# Altium footprint library 总库.PcbLib: 264 footprints (part 2 of 17)
Each footprint in its own frame and in the unit in brackets; x right, y up, seen from the top. Pads: shape width x height; smd on the part's side, far side on the other; paste and mask are expansions set on the pad; w line width, h text height; cw(c..) or ccw(c..) is an arc to the next point about the centre after c.
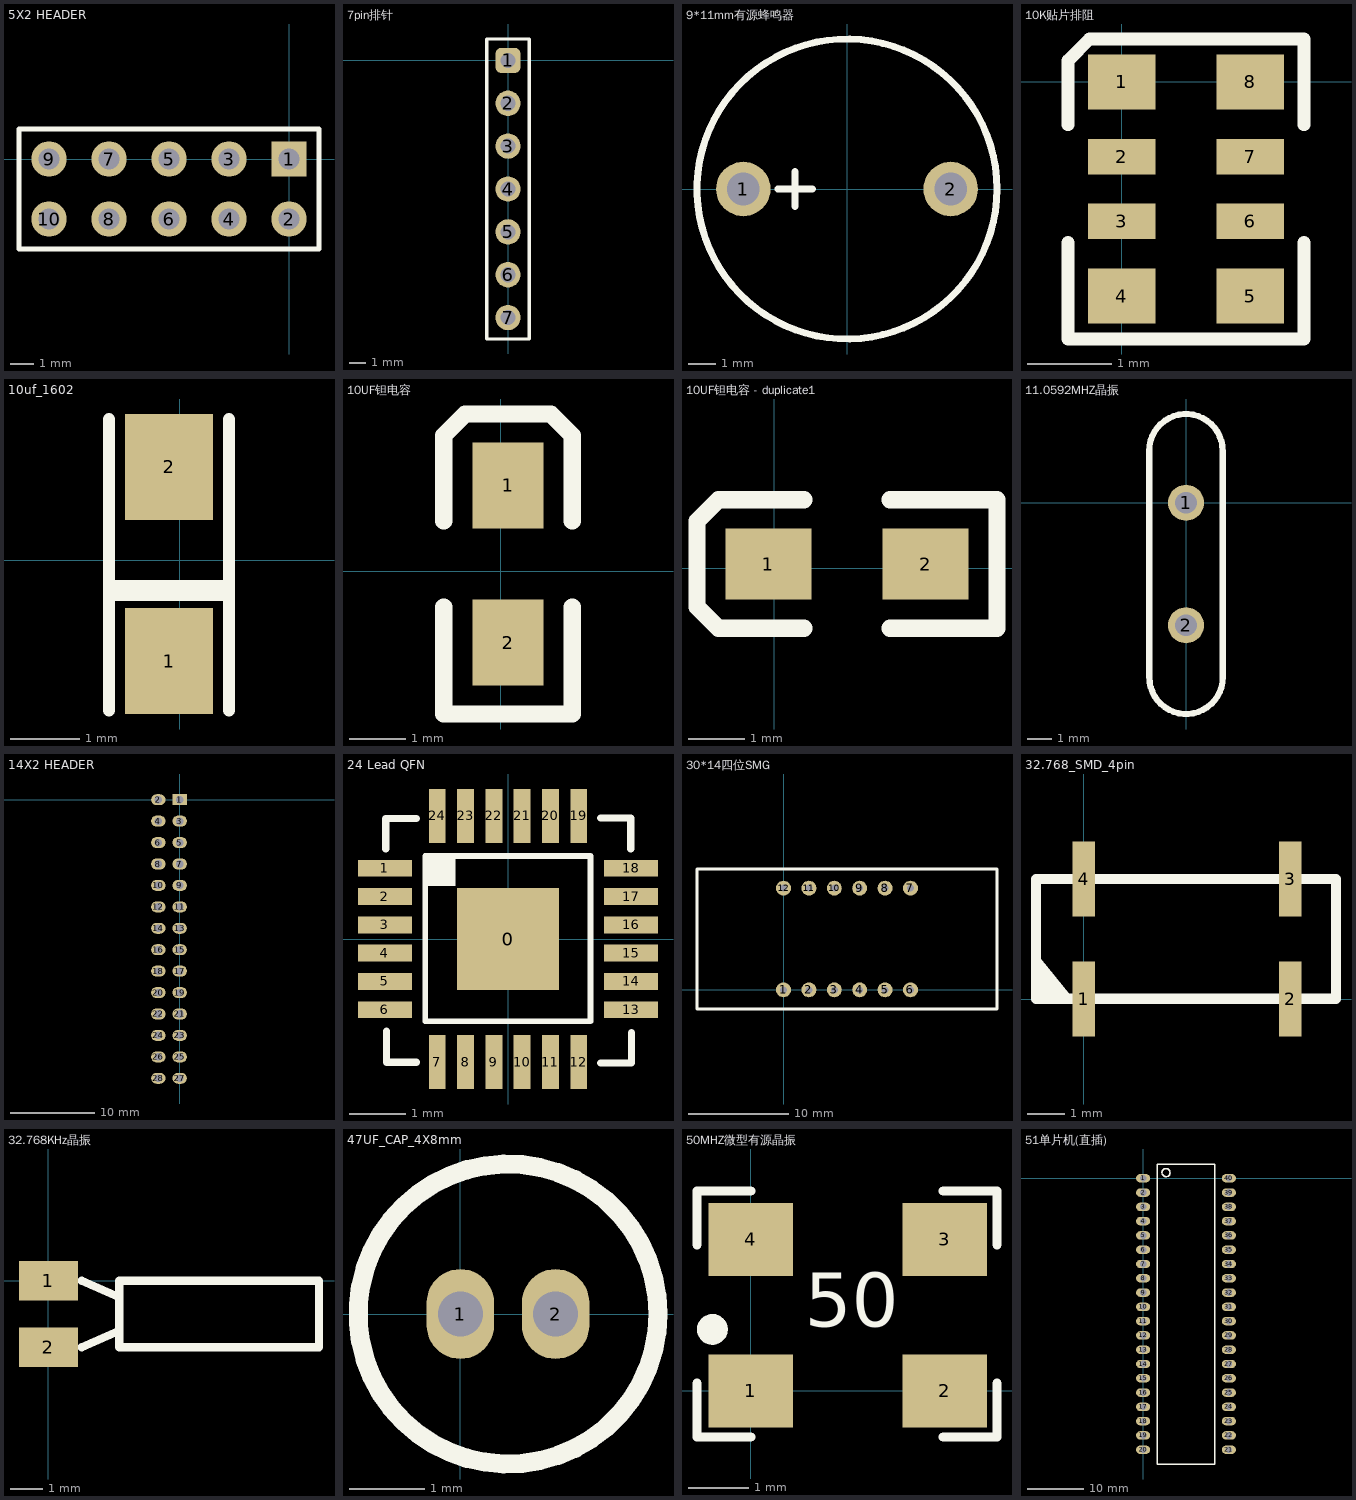
[diagram p1: the footprints below, top view; thin cyan lines are the x and y axes]

## 5X2 HEADER [mm]
pads (10):
  rect 1.5x1.5 hole 0.9: 1(0,0)
  round 1.5 hole 0.9: 2(0,-2.54) 3(-2.54,0) 4(-2.54,-2.54) 5(-5.08,0) 6(-5.08,-2.54) 7(-7.62,0) 8(-7.62,-2.54) 9(-10.16,0) 10(-10.16,-2.54)
Top Overlay:
  lines w0.2: -11.43,-3.81 1.27,-3.81 1.27,1.27 -11.43,1.27 -11.43,-3.81
3D body: height 8.51, standoff -2.99, extent -11.53,-3.91 1.17,1.17

## 7pin排针 [mm]
pads (7):
  rrect50% 1.5x1.5 hole 0.9: 1(0,0)
  round 1.5 hole 0.9: 2(0,-2.54) 3(0,-5.08) 4(0,-7.62) 5(0,-10.16) 6(0,-12.7) 7(0,-15.24)
Top Overlay:
  lines w0.203: -1.27,-16.51 1.27,-16.51 1.27,1.27 -1.27,1.27 -1.27,-16.51
3D body: height 8.54, standoff -3, extent -1.27,-16.51 1.22,1.27

## 9*11mm有源蜂鸣器 [mm]
pads (2):
  round 2 hole 1.2: 1(-3.8,0) 2(3.8,0)
Top Overlay:
  circle w0.254: c0,0 r5.5
  lines w0.254: -2.54,0 -1.27,0 ; -1.905,-0.635 -1.905,0.635

## 10K贴片排阻 [mm]
pads (8):
  rect 0.8x0.65 smd: 1(0,0) 4(0,-2.54) 5(1.524,-2.54) 8(1.524,0)
  rect 0.8x0.42 smd: 2(0,-0.889) 3(0,-1.651) 6(1.524,-1.651) 7(1.524,-0.889)
Top Overlay:
  lines w0.152: -0.635,-1.905 -0.635,-3.048 2.159,-3.048 2.159,-1.905 ; -0.635,-0.508 -0.635,0.254 -0.381,0.508 2.159,0.508 2.159,-0.508

## 10uf_1602 [mil]
pads (2):
  rect 50x60 smd: 1(-6,-57) 2(-6,53)
Top Overlay:
  lines w7: -40,-85 -40,80 ; 28,-85 28,80
  lines w12: -36,-17 24,-17
3D body: height 66.93, standoff 0, extent -39.48,-37.96 27.48,-24
3D body: height 62.99, standoff 0, extent -37.5,-65 25.5,60.98

## 10UF钽电容 [mil]
pads (2):
  rect 50x60 smd: 1(5,60) 2(5,-50)
Top Overlay:
  lines w12: -40,-25 -40,-100 50,-100 50,-25 ; -40,35 -40,95 -25,110 35,110 50,95 50,35
3D body: height 62.99, standoff 0, extent -26.5,-57.98 36.5,68

## 10UF钽电容 - duplicate1 [mil]
pads (2):
  rect 60x50 smd: 1(-4,3) 2(106,3)
Top Overlay:
  lines w12: 21,-42 -39,-42 -54,-27 -54,33 -39,48 21,48 ; 81,-42 156,-42 156,48 81,48
3D body: height 62.99, standoff 0, extent -12,-28.5 113.98,34.5

## 11.0592MHZ晶振 [mm]
pads (2):
  round 1.5 hole 0.9: 1(0,0) 2(0,-5.08)
Top Overlay:
  lines w0.254: -1.524,-7.239 -1.524,2.159 cw(c-0.002,2.159) 1.519,2.159 ; -1.519,-7.239 ccw(c0.002,-7.239) 1.524,-7.239 1.524,2.159

## 14X2 HEADER [mm]
pads (28):
  rect 1.7x1.3 hole 0.9: 1(0,0)
  oval 1.7x1.3 hole 0.9: 2(-2.54,0) 3(0,-2.54) 4(-2.54,-2.54) 5(0,-5.08) 6(-2.54,-5.08) 7(0,-7.62) 8(-2.54,-7.62) 9(0,-10.16) 10(-2.54,-10.16) 11(0,-12.7) 12(-2.54,-12.7) 13(0,-15.24) 14(-2.54,-15.24) 15(0,-17.78) 16(-2.54,-17.78) 17(0,-20.32) 18(-2.54,-20.32) 19(0,-22.86) 20(-2.54,-22.86) 21(0,-25.4) 22(-2.54,-25.4) 23(0,-27.94) 24(-2.54,-27.94) 25(0,-30.48) 26(-2.54,-30.48) 27(0,-33.02) 28(-2.54,-33.02)
Bottom Overlay:
  lines w0.2: -3.81,-34.29 -3.81,1.27 1.27,1.27 1.27,-34.29 -3.81,-34.29
3D body: height 2.48, standoff -9.02, extent -3.759,-21.539 1.321,-8.839
3D body: height 2.48, standoff -9.02, extent -3.785,-34.239 1.295,-21.539
3D body: height 2.48, standoff -9.02, extent -3.734,-8.966 1.346,1.194

## 24 Lead QFN [mm]
height 1.75
pads (25):
  rect 1.8x1.8 smd: 0(0,0)
  rect 0.95x0.3 smd: 1(-2.175,1.25) 2(-2.175,0.75) 3(-2.175,0.25) 4(-2.175,-0.25) 5(-2.175,-0.75) 6(-2.175,-1.25) 13(2.175,-1.25) 14(2.175,-0.75) 15(2.175,-0.25) 16(2.175,0.25) 17(2.175,0.75) 18(2.175,1.25)
  rect 0.3x0.95 smd: 7(-1.25,-2.175) 8(-0.75,-2.175) 9(-0.25,-2.175) 10(0.25,-2.175) 11(0.75,-2.175) 12(1.25,-2.175) 19(1.25,2.175) 20(0.75,2.175) 21(0.25,2.175) 22(-0.25,2.175) 23(-0.75,2.175) 24(-1.25,2.175)
Top Overlay:
  rectangle: -1.438,0.934 -0.93,1.442
  lines w0.1: -1.463,-1.453 1.458,-1.453 1.458,1.468 -1.463,1.468 -1.463,-1.453
  lines w0.127: -2.161,1.595 -2.161,2.128 -1.616,2.128 ; -2.149,-1.631 -2.149,-2.177 -1.616,-2.177 ; 1.636,-2.19 2.181,-2.19 2.181,-1.657 ; 1.636,2.14 2.169,2.14 2.169,1.595
3D body: height 0.89, standoff 0, extent -2.022,-2.063 2.042,2.001

## 30*14四位SMG [mm]
pads (12):
  round 1.5 hole 0.7: 1(0,0) 2(2.54,0) 3(5.08,0) 4(7.62,0) 5(10.16,0) 6(12.7,0) 7(12.7,10.16) 8(10.16,10.16) 9(7.62,10.16) 10(5.08,10.16) 11(2.54,10.16) 12(0,10.16)
Top Overlay:
  lines w0.254: -8.65,-1.92 -8.65,12.08 21.35,12.08 21.35,-1.92 -8.65,-1.92

## 32.768_SMD_4pin [mm]
pads (4):
  rect 0.6x2 smd: 1(0,0) 2(5.512,0) 3(5.512,3.2) 4(0,3.2)
Top Overlay:
  lines w0.254: -1.269,0.025 6.731,0.025 ; -1.245,1.016 -0.457,0.025 -1.168,0.584 -0.94,0.127 -1.118,0.229 ; -1.27,0 -1.27,3.2 6.731,3.2 6.731,0 -1.27,0
3D body: height 1.3, standoff -0.2, extent -0.807,0.024 6.293,3.124

## 32.768KHz晶振 [mm]
pads (2):
  rect 1.8x1.2 smd: 1(0,0) 2(0,-2.032)
Top Overlay:
  lines w0.254: 1.016,-2.032 2.159,-1.524 ; 1.016,0 2.159,-0.508 ; 2.159,-2.032 2.159,0 8.255,0 8.255,-2.032 2.159,-2.032

## 47UF_CAP_4X8mm [mm]
pads (2):
  oval 0.9x1.2 hole 0.6: 1(0,0) 2(1.27,0)
Top Overlay:
  circle w0.254: c0.635,0 r2
3D body: height 6.93, standoff -17.07, extent -1.374,-2.009 2.626,1.991

## 50MHZ微型有源晶振 [mm]
pads (4):
  rect 1.4x1.2 smd: 1(0,0) 2(3.2,0) 3(3.2,2.5) 4(0,2.5)
Top Overlay:
  circle w0.254: c-0.635,1.016 r0.127
  lines w0.152: -0.889,0.127 -0.889,-0.762 0,-0.762 ; -0.889,2.413 -0.889,3.302 0,3.302 ; 3.175,-0.762 4.064,-0.762 4.064,0.127 ; 3.175,3.302 4.064,3.302 4.064,2.413
  text "50" at 0.889,0.762 h1.52
3D body: height 1.09, standoff 0, extent 0.371,0.371 0.645,0.645
3D body: height 1.05, standoff 0, extent -0.127,-0.127 3.327,2.627

## 51单片机(直插) [mm]
pads (40):
  oval 2.5x1.5 hole 1.2: 1(0,0) 2(0,-2.54) 3(0,-5.08) 4(0,-7.62) 5(0,-10.16) 6(0,-12.7) 7(0,-15.24) 8(0,-17.78) 9(0,-20.32) 10(0,-22.86) 11(0,-25.4) 12(0,-27.94) 13(0,-30.48) 14(0,-33.02) 15(0,-35.56) 16(0,-38.1) 17(0,-40.64) 18(0,-43.18) 19(0,-45.72) 20(0,-48.26) 21(15.24,-48.26) 22(15.24,-45.72) 23(15.24,-43.18) 24(15.24,-40.64) 25(15.24,-38.1) 26(15.24,-35.56) 27(15.24,-33.02) 28(15.24,-30.48) 29(15.24,-27.94) 30(15.24,-25.4) 31(15.24,-22.86) 32(15.24,-20.32) 33(15.24,-17.78) 34(15.24,-15.24) 35(15.24,-12.7) 36(15.24,-10.16) 37(15.24,-7.62) 38(15.24,-5.08) 39(15.24,-2.54) 40(15.24,0)
Top Overlay:
  circle w0.254: c4.064,1.016 r0.718
  lines w0.254: 2.54,-50.8 12.7,-50.8 12.7,2.54 2.54,2.54 2.54,-50.8
3D body: height 7.8, standoff -3.36, extent -1.016,-50.292 16.584,1.968